# Altium footprint library Connector.PcbLib: 230 footprints (part 11 of 15)
Each footprint in its own frame and in the unit in brackets; x right, y up, seen from the top. Pads: shape width x height; smd on the part's side, far side on the other; paste and mask are expansions set on the pad; w line width, h text height; cw(c..) or ccw(c..) is an arc to the next point about the centre after c.
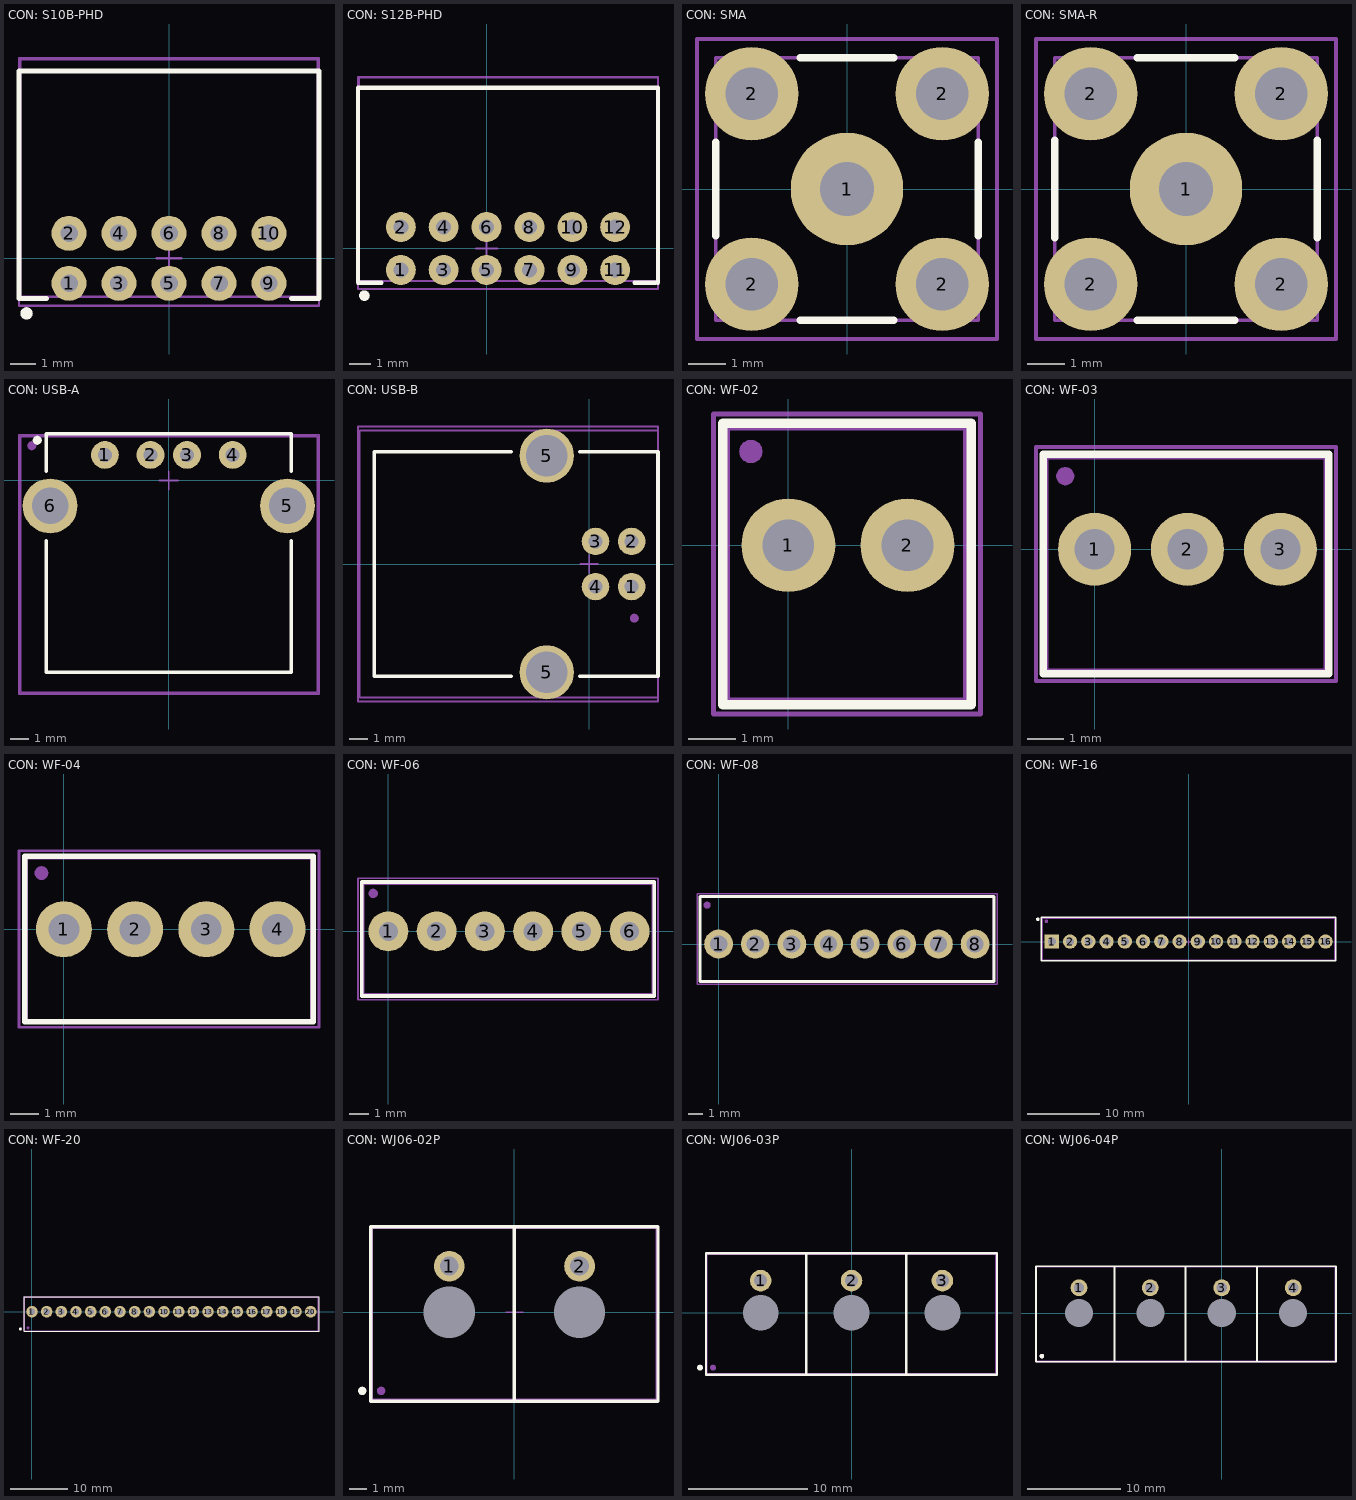
[diagram p10: the footprints below, top view; thin cyan lines are the x and y axes]

## CON: S10B-PHD [mm]
pads (11):
  round 1.4 hole 0.7: 1(-4,-1) 2(-4,1) 3(-2,-1) 4(-2,1) 5(0,-1) 6(0,1) 7(2,-1) 8(2,1) 9(4,-1) 10(4,1)
  round 0.5 on Top Overlay: ""(-5.7,-2.2)
Top Overlay:
  lines w0.2: -4.9,-1.6 -5.9,-1.6 -6,-1.6 -6,7.5 6,7.5 6,-1.6 5.9,-1.6 4.9,-1.6
TopAssy:
  lines w0.1: -5.95,-1.525 5.95,-1.525 5.95,7.975 -5.95,7.975 -5.95,-1.525
Border:
  lines w0.1: -0.5,0 0.5,0 ; 0,-0.5 0,0.5 ; -6,-1.9 -6,8 6,8 6,-1.9 -6,-1.9
3D body "S10B-PHD.STEP": height 5, standoff -3, extent -5.95,-1.525 5.95,7.975

## CON: S12B-PHD [mm]
pads (13):
  round 1.4 hole 0.7: 1(-4,-1) 2(-4,1) 3(-2,-1) 4(-2,1) 5(0,-1) 6(0,1) 7(2,-1) 8(2,1) 9(4,-1) 10(4,1) 11(6,-1) 12(6,1)
  round 0.5 on Top Overlay: ""(-5.7,-2.2)
Top Overlay:
  lines w0.2: -4.9,-1.6 -5.9,-1.6 -6,-1.6 -6,7.5 8,7.5 8,-1.6 ; 6.9,-1.6 7.9,-1.6
TopAssy:
  lines w0.1: -5.95,-1.525 8,-1.525 8,7.975 -5.95,7.975 -5.95,-1.525
Border:
  lines w0.1: -0.5,0 0.5,0 ; 0,-0.5 0,0.5 ; -6,-1.9 8,-1.9 8,8 -6,8 -6,-1.9
3D body "S12B-PHDSS.STEP": height 5, standoff 0, extent -5.95,-1.525 7.95,7.975

## CON: SMA [mm]
pads (5):
  round 3 hole 1.45: 1(0,0)
  round 2.5 hole 1.4: 2(-2.54,-2.54) 2(-2.54,2.54) 2(2.54,-2.54) 2(2.54,2.54)
Top Overlay:
  lines w0.2: -3.5,-1.25 -3.5,1.25 ; -1.25,-3.5 1.25,-3.5 ; -1.25,3.5 1.25,3.5 ; 3.5,-1.25 3.5,1.25
TopAssy:
  lines w0.1: -3.5,-3.5 -3.5,3.5 3.5,3.5 3.5,-3.5 -3.5,-3.5
Border:
  lines w0.1: -0.5,0 0.5,0 ; 0,-0.5 0,0.5 ; -4,-4 -4,4 4,4 4,-4 -4,-4
3D body "SMA_connector.STEP": height 9.53, standoff -3.94, extent -3.5,-3.5 3.5,3.5

## CON: SMA-R [mm]
pads (5):
  round 3 hole 1.45: 1(0,0)
  round 2.5 hole 1.4: 2(-2.54,-2.54) 2(-2.54,2.54) 2(2.54,-2.54) 2(2.54,2.54)
Top Overlay:
  lines w0.2: -3.5,-1.3 -3.5,1.3 ; -1.3,-3.5 1.3,-3.5 ; -1.3,3.5 1.3,3.5 ; 3.5,-1.3 3.5,1.3
TopAssy:
  lines w0.1: -3.5,-3.5 -3.5,3.5 3.5,3.5 3.5,-3.5 -3.5,-3.5
Border:
  lines w0.1: -0.5,0 0.5,0 ; 0,-0.5 0,0.5 ; -4,-4 -4,4 4,4 4,-4 -4,-4
3D body "Samtec-SMA-J-P-H-RA-TH1.STEP": height 10.26, standoff -3.84, extent -3.5,-3.5 3.5,11.6

## CON: USB-A [mm]
height 5
pads (8):
  round 1.524 hole 0.762: 1(-3.5,1.397) 2(-1,1.397) 3(1,1.397) 4(3.5,1.397)
  round 3 hole 2: 5(6.5,-1.397) 6(-6.5,-1.397)
  round 0.5 on Mech1: ""(-7.5,1.9)
  round 0.5 on Top Overlay: ""(-7.2,2.2)
Top Overlay:
  lines w0.2: -6.7,-3.294 -6.7,-10.5 6.7,-10.5 6.7,-3.294 ; -6.7,0.5 -6.7,2.55 6.7,2.55 6.7,0.5
TopAssy:
  lines w0.1: -8.105,-11.593 -8.105,2.407 8.129,2.407 8.129,-11.593 -8.105,-11.593
Border:
  lines w0.1: -0.5,0 0.5,0 ; 0,-0.5 0,0.5 ; -8.2,-11.7 8.225,-11.7 8.225,2.5 -8.2,2.5 -8.2,-11.7
3D body "USB_A_PCB.STEP": height 7.66, standoff -3.62, extent -8.105,-11.593 8.129,2.407

## CON: USB-B [mm] "USB-B connector on PCB"
height 12
pads (7):
  round 1.524 hole 0.762: 1(2.35,-1.25) 2(2.35,1.25) 3(0.35,1.25) 4(0.35,-1.25)
  round 3 hole 2.3: 5(-2.35,-6) 5(-2.35,6)
  round 0.5 on Mech1: ""(2.5,-3)
Top Overlay:
  lines w0.2: -4.318,-6.223 -11.9,-6.223 -11.9,6.223 -4.318,6.223 ; -0.508,-6.223 3.81,-6.223 3.81,6.223 -0.508,6.223
TopAssy:
  lines w0.1: -12.708,-7.399 3.792,-7.399 3.792,7.4 -12.708,7.4 -12.708,-7.399
Border:
  lines w0.1: -0.5,0 0.5,0 ; 0,-0.5 0,0.5 ; -12.8,-7.62 3.81,-7.62 3.81,7.62 -12.8,7.62 -12.8,-7.62
3D body "USB-B-S-X-W-TH.STEP": height 11, standoff -3.64, extent -12.708,-7.398 3.792,7.4

## CON: WF-02 [mm]
pads (3):
  round 2 hole 1.1: 1(0,0) 2(2.54,0)
  round 0.5 on Mech1: ""(-0.8,2)
Top Overlay:
  lines w0.2: -1.4,-3.4 3.9,-3.4 3.9,2.6 -1.4,2.6 -1.4,-3.4
TopAssy:
  lines w0.1: -1.3,-3.3 -1.3,2.5 3.78,2.5 3.78,-3.3 -1.3,-3.3
Border:
  lines w0.1: -1.6,-3.6 -1.6,2.8 4.1,2.8 4.1,-3.6 -1.6,-3.6
3D body "User Library-WF-02.STEP": height 11.5, standoff -3.3, extent -1.3,-3.3 3.78,2.5

## CON: WF-03 [mm]
pads (4):
  round 2 hole 1.1: 1(0,0) 2(2.54,0) 3(5.08,0)
  round 0.5 on Mech1: ""(-0.8,2)
Top Overlay:
  lines w0.2: -1.4,-3.4 6.4,-3.4 6.4,2.6 -1.4,2.6 -1.4,-3.4
TopAssy:
  lines w0.1: -1.31,-3.3 6.31,-3.3 6.31,2.5 -1.31,2.5 -1.31,-3.3
Border:
  lines w0.1: -1.6,-3.6 -1.6,2.8 6.6,2.8 6.6,-3.6 -1.6,-3.6
3D body "User Library-WF-03.STEP": height 11.5, standoff -3.3, extent -1.31,-3.3 6.31,2.5

## CON: WF-04 [mm]
pads (5):
  round 2 hole 1.1: 1(0,0) 2(2.54,0) 3(5.08,0) 4(7.62,0)
  round 0.5 on Mech1: ""(-0.8,2)
Top Overlay:
  lines w0.2: -1.4,-3.3 -1.4,2.6 8.9,2.6 8.9,-3.3 -1.4,-3.3
TopAssy:
  lines w0.1: -1.33,-3.273 -1.33,2.527 8.83,2.527 8.83,-3.273 -1.33,-3.273
Border:
  lines w0.1: -1.6,-3.5 -1.6,2.8 9.1,2.8 9.1,-3.5 -1.6,-3.5
3D body "User Library-WF-04.STEP": height 11.66, standoff -3.14, extent -1.33,-3.273 8.83,2.527

## CON: WF-06 [mm]
pads (7):
  round 2.1 hole 1: 1(0,0) 2(2.54,0) 3(5.08,0) 4(7.62,0) 5(10.16,0) 6(12.7,0)
  round 0.5 on Mech1: ""(-0.8,2)
Top Overlay:
  lines w0.2: -1.4,-3.4 -1.4,2.6 14,2.6 14,-3.4 -1.4,-3.4
TopAssy:
  lines w0.1: -1.32,-3.3 -1.32,2.5 13.92,2.5 13.92,-3.3 -1.32,-3.3
Border:
  lines w0.1: -1.6,-3.6 -1.6,2.8 14.2,2.8 14.2,-3.6 -1.6,-3.6
3D body "User Library-WF-06.STEP": height 11.5, standoff -3.3, extent -1.32,-3.3 13.92,2.5

## CON: WF-08 [mm]
pads (9):
  round 2 hole 1.2: 1(0,0) 2(2.54,0) 3(5.08,0) 4(7.62,0) 5(10.16,0) 6(12.7,0) 7(15.24,0) 8(17.78,0)
  round 0.5 on Mech1: ""(-0.8,2.7)
Top Overlay:
  lines w0.2: -1.3,-2.6 19.1,-2.6 19.1,3.3 -1.3,3.3 -1.3,-2.6
TopAssy:
  lines w0.1: -1.27,-2.54 -1.27,3.26 19.05,3.26 19.05,-2.54 -1.27,-2.54
Border:
  lines w0.1: -1.5,-2.8 -1.5,3.5 19.3,3.5 19.3,-2.8 -1.5,-2.8
3D body "User Library-WF-8.STEP": height 11.4, standoff -3.4, extent -1.27,-2.54 19.05,3.26

## CON: WF-16 [mm]
height 10
pads (18):
  rect 2x2 hole 1.1: 1(-19.05,0)
  round 2 hole 1.1: 2(-16.51,0) 3(-13.97,0) 4(-11.43,0) 5(-8.89,0) 6(-6.35,0) 7(-3.81,0) 8(-1.27,0) 9(1.27,0) 10(3.81,0) 11(6.35,0) 12(8.89,0) 13(11.43,0) 14(13.97,0) 15(16.51,0) 16(19.05,0)
  round 0.5 on Top Overlay: ""(-21,3.1)
  round 0.5 on Mech1: ""(-19.8,2.8)
Top Overlay:
  lines w0.2: -20.5,-2.7 20.5,-2.7 20.5,3.4 -20.5,3.4 -20.5,-2.7
TopAssy:
  lines w0.1: -20.32,-2.54 -20.32,3.26 20.32,3.26 20.32,-2.54 -20.32,-2.54
Border:
  lines w0.1: -0.5,0 0.5,0 ; 0,-0.5 0,0.5 ; -20.4,-2.6 20.4,-2.6 20.4,3.3 -20.4,3.3 -20.4,-2.6
3D body "User Library-WF-8.STEP": height 11.4, standoff -3.4, extent -20.32,-2.54 0,3.26
3D body "User Library-WF-8.STEP": height 11.4, standoff -3.4, extent 0,-2.54 20.32,3.26

## CON: WF-20 [mm]
pads (22):
  round 0.5 on Top Overlay: 0(-2,-3)
  round 2 hole 1.1: 1(0,0) 2(2.54,0) 3(5.08,0) 4(7.62,0) 5(10.16,0) 6(12.7,0) 7(15.24,0) 8(17.78,0) 9(20.32,0) 10(22.86,0) 11(25.4,0) 12(27.94,0) 13(30.48,0) 14(33.02,0) 15(35.56,0) 16(38.1,0) 17(40.64,0) 18(43.18,0) 19(45.72,0) 20(48.26,0)
  round 0.5 on Mech1: ""(-0.7,-2.8)
Top Overlay:
  lines w0.2: -1.35,-3.4 49.7,-3.4 49.7,2.6 -1.35,2.6 -1.35,-3.4
TopAssy:
  lines w0.1: -1.24,-3.3 49.6,-3.3 49.6,2.5 -1.24,2.5 -1.24,-3.3
Border:
  lines w0.1: -1.325,-3.375 -1.325,2.575 49.65,2.575 49.65,-3.375 -1.325,-3.375
3D body "WF-20.stp": height 11.51, standoff -3.29, extent -1.24,-3.3 49.6,2.5

## CON: WJ06-02P [mm]
pads (6):
  round 1.8 hole 1.1: 1(-3.81,2.7) 2(3.81,2.7)
  round 0.5 on Top Overlay: ""(-8.9,-4.6)
  round 0.5 on Mech1: ""(-7.8,-4.6)
  round 2.4 hole 3: ""(-3.81,0) ""(3.81,0)
Top Overlay:
  lines w0.2: 0,-5.2 0,5 ; -8.4,-5.2 8.4,-5.2 8.4,5 -8.4,5 -8.4,-5.2
TopAssy:
  lines w0.1: -8.31,-5.08 -8.31,4.92 8.31,4.92 8.31,-5.08 -8.31,-5.08
Border:
  lines w0.1: -0.5,0 0.5,0 ; 0,-0.5 0,0.5 ; -8.4,-5.175 8.4,-5.175 8.4,5 -8.4,5 -8.4,-5.175
3D body "разъем.STEP": height 6.01, standoff 0.01, extent -8.31,-5.08 8.31,4.92

## CON: WJ06-03P [mm]
pads (8):
  round 1.8 hole 1.1: 1(-7.62,2.7) 2(0,2.7) 3(7.62,2.7)
  round 0.5 on Top Overlay: ""(-12.71,-4.6)
  round 0.5 on Mech1: ""(-11.61,-4.6)
  round 2.4 hole 3: ""(-7.62,0) ""(0,0) ""(7.62,0)
Top Overlay:
  lines w0.2: -3.81,-5.2 -3.81,5 ; 4.59,-5.2 12.2,-5.2 12.2,5 4.59,5 ; 4.59,-5.2 -12.21,-5.2 -12.21,5 4.59,5 ; 4.59,-5.2 4.59,5
TopAssy:
  lines w0.1: -12.12,-5.08 12.1,-5.08 12.1,4.92 -12.12,4.92 -12.12,-5.08
Border:
  lines w0.1: -0.5,0 0.5,0 ; 0,-0.5 0,0.5 ; -12.21,-5.175 -12.21,5 4.59,5 4.59,-5.175 -12.21,-5.175
3D body "Разъем 3х7.62.STEP": height 6, standoff 0, extent -12.12,-5.08 12.12,4.92

## CON: WJ06-04P [mm]
pads (10):
  round 1.8 hole 1.1: 1(-15.24,2.7) 2(-7.62,2.7) 3(0,2.7) 4(7.63,2.7)
  round 0.5 on Mech1: ""(-19.2,-4.6)
  round 0.5 on Top Overlay: ""(-19.2,-4.6)
  round 2.4 hole 3: ""(-15.24,0) ""(-7.62,0) ""(0,0) ""(7.62,0)
Top Overlay:
  lines w0.2: -11.43,-5.2 -11.43,5 ; -3.03,-5.2 -19.83,-5.2 -19.83,5 -3.03,5 ; 3.78,-5.2 3.78,5 ; -3.87,-5.2 12.2,-5.2 12.2,5 -3.87,5 -3.87,-5.2
TopAssy:
  lines w0.1: -19.74,-5.08 12.1,-5.08 12.1,4.92 -19.74,4.92 -19.74,-5.08
Border:
  lines w0.1: -8.12,0 -7.12,0 ; -7.62,-0.5 -7.62,0.5 ; -19.83,-5.175 -19.83,5 12.2,5 12.2,-5.175 -19.83,-5.175
3D body "Разъем 4pin.STEP": height 5.95, standoff -0.05, extent -19.74,-5.08 12.12,4.92